# Altium schematic symbol library Schlib.SchLib: 725 symbols (part 3 of 6) (continued)
## GRM21AR72A224KAC5L
designator C?  value 0.22 uF  (hidden comment: *)
Multilayer Ceramic Capacitor, 0.22 uF, 100 V, ± 10%, X7R, 0805 [2012 Metric]; Manufacturer: Murata; Manufacturer Part Number: GRM21AR72A224KAC5L; Supplier: Mouser; Supplier Part Number: 81-GRM21AR72A224KC5L; RoHS: Yes; Category: Ceramic Capacitors; Stock: 53713; Pricing: 1=0.26, 10=0.117, 50=0.117, 100=0.071, 1000=0.06, 10000=0.047 (USD); ComponentLink1URL: https://datasheet.ciiva.com/3777/194grm21ar72a224kac523-3777637.pdf?src-supplier=Arrow+Electronics; ComponentLink1Description: https://datasheet.ciiva.com/3777/194grm21ar72a224kac523-3777637.pdf?src-supplier=Arrow+Electronics; ComponentLink2URL: https://datasheet.ciiva.com/2989/product-2989680.pdf?src-supplier=Avnet; ComponentLink2Description: https://datasheet.ciiva.com/2989/product-2989680.pdf?src-supplier=Avnet; ComponentLink3URL: https://datasheet.ciiva.com/11787/0900766b80ef921d-11787385.pdf?src-supplier=Rs; ComponentLink3Description: https://datasheet.ciiva.com/11787/0900766b80ef921d-11787385.pdf?src-supplier=Rs; ComponentLink4URL: https://datasheet.ciiva.com/29200/453038-da-01-en-vs-kondensator-0805-29200660.pdf?src-supplier=Conrad; ComponentLink4Description: https://datasheet.ciiva.com/29200/453038-da-01-en-vs-kondensator-0805-29200660.pdf?src-supplier=Conrad; ComponentLink5URL: https://datasheet.ciiva.com/6270/partnumbering-e-01-6270361.pdf?src-supplier=Digikey; ComponentLink5Description: https://datasheet.ciiva.com/6270/partnumbering-e-01-6270361.pdf?src-supplier=Digikey; ComponentLink6URL: https://datasheet.ciiva.com/6270/partnumbering-e-01-6270363.pdf?src-supplier=Digikey; ComponentLink6Description: https://datasheet.ciiva.com/6270/partnumbering-e-01-6270363.pdf?src-supplier=Digikey; ComponentLink7URL: https://datasheet.ciiva.com/6270/partnumbering-e-01-6270364.pdf?src-supplier=Digikey; ComponentLink7Description: https://datasheet.ciiva.com/6270/partnumbering-e-01-6270364.pdf?src-supplier=Digikey; ComponentLink8URL: https://datasheet.ciiva.com/16385/product-16385854.pdf?src-supplier=Future+Electronics; ComponentLink8Description: https://datasheet.ciiva.com/16385/product-16385854.pdf?src-supplier=Future+Electronics; Case/Package: 0805
footprint C 0805
pins: 1 B, 2 A

## GRM21BR61A476ME15L
designator C?  value 47uF  (hidden comment: *)
Multilayer Ceramic Capacitor, 47 uF, 10 V, ï¿½ 20%, X5R, 0805 [2012 Metric]; Manufacturer: Murata; Manufacturer Part Number: GRM21BR61A476ME15L; Material: 4241ConductorMaterial; Voltage Rating: 10V; Dissipation Factor: 0.035%; Supplier: Farnell; Supplier Part Number: 2611939; RoHS: Yes; Category: Ceramic Capacitors; Stock: 320783; Pricing: 5=0.389, 50=0.251, 250=0.234, 500=0.217, 1500=0.213 (EUR); Mounting Technology: Surface Mount; Case/Package: 0805; Case Code (Metric): 2012; Case Code (Imperial): 0805; Dielectric Material: Ceramic; Min Operating Temperature: -55°C; Max Operating Temperature: 85°C; Tolerance: 20%; Packaging: Cut Tape; Dielectric: X5R; Voltage: 10V; Termination: SMD/SMT; Voltage Rating (DC): 10V; Series: GRM; Length: 0.079inch; Width: 0.049inch; Height: 1.25mm; Thickness: 0.057inch; Depth: 1.25mm; Reach SVHC Compliant: No; Lead Free: Lead Free; RoHS Compliant: Yes; ComponentLink1URL: http://www.farnell.com/datasheets/2079183.pdf?src-supplier=Farnell; ComponentLink1Description: http://www.farnell.com/datasheets/2079183.pdf?src-supplier=Farnell; ComponentLink2URL: http://www.farnell.com/datasheets/2079183.pdf?src-supplier=Newark; ComponentLink2Description: http://www.farnell.com/datasheets/2079183.pdf?src-supplier=Newark; ComponentLink3URL: http://www.farnell.com/datasheets/2079183.pdf?src-supplier=Element14; ComponentLink3Description: http://www.farnell.com/datasheets/2079183.pdf?src-supplier=Element14; ComponentLink4URL: https://datasheet.octopart.com/GRM21BR61A476ME15L-Murata-datasheet-66077109.pdf?src-supplier=Element14; ComponentLink4Description: https://datasheet.octopart.com/GRM21BR61A476ME15L-Murata-datasheet-66077109.pdf?src-supplier=Element14; ComponentLink5URL: http://search.murata.co.jp/Ceramy/image/img/A01X/G101/ENG/GRM21BR61A476ME15-01.pdf?src-supplier=Digikey; ComponentLink5Description: http://search.murata.co.jp/Ceramy/image/img/A01X/G101/ENG/GRM21BR61A476ME15-01.pdf?src-supplier=Digikey; ComponentLink6URL: https://search.murata.co.jp/Ceramy/image/img/A01X/G101/ENG/GRM21BR61A476ME15-01.pdf?src-supplier=Digikey; ComponentLink6Description: https://search.murata.co.jp/Ceramy/image/img/A01X/G101/ENG/GRM21BR61A476ME15-01.pdf?src-supplier=Digikey; ComponentLink7URL: http://psearch.en.murata.com/capacitor/product/GRM21BR61A476ME15%23.pdf?src-supplier=Avnet; ComponentLink7Description: http://psearch.en.murata.com/capacitor/product/GRM21BR61A476ME15%23.pdf?src-supplier=Avnet
footprint C 0805
pins: 1 B, 2 A

## GRM21BR61E226ME44K
designator C?  value 22uF  (hidden comment: *)
Multilayer Ceramic Capacitor, 22 uF, 25 V, ± 20%, X5R, 0805 [2012 Metric]; Manufacturer: Murata; Manufacturer Part Number: GRM21BR61E226ME44K; Material: 4241ConductorMaterial; Voltage Rating: 25V; Supplier: Future Electronics; Supplier Part Number: 1092989; RoHS: Yes; Category: Ceramic Capacitors; Stock: 140000; Pricing: 10000=0.0652, 20000=0.0635, 30000=0.0618 (USD); Mounting Technology: Surface Mount; Case/Package: 0805; Case Code (Imperial): 0805; Case Code (Metric): 2012; Weight: 0.000335oz; Min Operating Temperature: -55°C; Max Operating Temperature: 85°C; Packaging: Tape and Reel; Tolerance: 20%; Dielectric: X5R; Termination: SMD/SMT; Voltage Rating (DC): 25V; Package Quantity: 10000; Series: GRM; Length: 0.079inch; Width: 1.25mm; Height: 1.25mm; Thickness: 0.057inch; RoHS Compliant: Yes; ComponentLink1URL: http://www.mouser.com/ds/2/281/c02e-2905.pdf?src-supplier=Mouser; ComponentLink1Description: http://www.mouser.com/ds/2/281/c02e-2905.pdf?src-supplier=Mouser; ComponentLink2URL: http://search.murata.co.jp/Ceramy/image/img/A01X/G101/ENG/GRM21BR61E226ME44-01.pdf?src-supplier=Digikey; ComponentLink2Description: http://search.murata.co.jp/Ceramy/image/img/A01X/G101/ENG/GRM21BR61E226ME44-01.pdf?src-supplier=Digikey; ComponentLink3URL: https://search.murata.co.jp/Ceramy/image/img/A01X/G101/ENG/GRM21BR61E226ME44-01.pdf?src-supplier=Digikey; ComponentLink3Description: https://search.murata.co.jp/Ceramy/image/img/A01X/G101/ENG/GRM21BR61E226ME44-01.pdf?src-supplier=Digikey
footprint C 0805
pins: 1 B, 2 A

## GRM21BR61H106KE43K
designator C?  value 10uF  (hidden comment: *)
Ceramic Capacitor, Multilayer, Ceramic, 50V, 10% +Tol, 10% -Tol, X5R, 10uF, Surface Mount, 0805; Manufacturer: Murata; Manufacturer Part Number: GRM21BR61H106KE43K; Material: 4241ConductorMaterial; Dielectric: 1537DielectricType; Supplier: Mouser; Supplier Part Number: 81-GRM21BR61H106KE3K; RoHS: Yes; Category: Ceramic Capacitors; Stock: 120155; Pricing: 1=0.34, 10=0.155, 50=0.155, 100=0.093, 1000=0.073, 10000=0.065 (USD); Case/Package: 339Case; Min Operating Temperature: -55°C; Max Operating Temperature: 85°C; Tolerance: 10%; Voltage Rating: 50V; Voltage Rating (DC): 50V; Length: 2mm; Width: 1.25mm; Height: 1.45mm; Thickness: 1.25mm
footprint C 0805
pins: 1 B, 2 A

## GRM21BR61H475KE51L
designator C?  value 4.7uF  (hidden comment: *)
Multilayer Ceramic Capacitor, 4.7 uF, 50 V, ± 10%, X5R, 0805 [2012 Metric]; Manufacturer: Murata; Manufacturer Part Number: GRM21BR61H475KE51L; Voltage Rating: 50V; Supplier: Mouser; Supplier Part Number: 81-GRM21BR61H475KE1L; RoHS: Yes; Category: Ceramic Capacitors; Stock: 623269; Pricing: 1=0.26, 10=0.107, 50=0.107, 100=0.062, 1000=0.054, 10000=0.042 (USD); Mounting Technology: Surface Mount; Case/Package: 0805; Case Code (Metric): 2012; Material: Ceramic; Case Code (Imperial): 0805; Min Operating Temperature: -55°C; Max Operating Temperature: 85°C; Tolerance: 10%; Packaging: Tape and Reel; Dielectric: X5R; Series: GRM; Voltage Rating (DC): 50V; Length: 2mm; Width: 0.049inch; Height: 1.25mm; Thickness: 0.055inch; Depth: 1.25mm; Reach SVHC Compliant: No; RoHS Compliant: Yes; Lead Free: 5697LeadFree; ComponentLink1URL: http://www.farnell.com/datasheets/2079186.pdf?src-supplier=Farnell; ComponentLink1Description: http://www.farnell.com/datasheets/2079186.pdf?src-supplier=Farnell; ComponentLink2URL: https://datasheet.octopart.com/GRM21BR61H475KE51L-Murata-datasheet-22122223.pdf?src-supplier=Future+Electronics; ComponentLink2Description: https://datasheet.octopart.com/GRM21BR61H475KE51L-Murata-datasheet-22122223.pdf?src-supplier=Future+Electronics; ComponentLink3URL: http://www.farnell.com/datasheets/2079186.pdf?src-supplier=Element14; ComponentLink3Description: http://www.farnell.com/datasheets/2079186.pdf?src-supplier=Element14; ComponentLink4URL: https://datasheet.octopart.com/GRM21BR61H475KE51L-Murata-datasheet-66077112.pdf?src-supplier=Element14; ComponentLink4Description: https://datasheet.octopart.com/GRM21BR61H475KE51L-Murata-datasheet-66077112.pdf?src-supplier=Element14; ComponentLink5URL: http://search.murata.co.jp/Ceramy/image/img/A01X/G101/ENG/GRM21BR61H475KE51-01.pdf?src-supplier=Digikey; ComponentLink5Description: http://search.murata.co.jp/Ceramy/image/img/A01X/G101/ENG/GRM21BR61H475KE51-01.pdf?src-supplier=Digikey; ComponentLink6URL: https://search.murata.co.jp/Ceramy/image/img/A01X/G101/ENG/GRM21BR61H475KE51-01.pdf?src-supplier=Digikey; ComponentLink6Description: https://search.murata.co.jp/Ceramy/image/img/A01X/G101/ENG/GRM21BR61H475KE51-01.pdf?src-supplier=Digikey; ComponentLink7URL: http://www.farnell.com/datasheets/2079186.pdf?src-supplier=Newark; ComponentLink7Description: http://www.farnell.com/datasheets/2079186.pdf?src-supplier=Newark
footprint C 0805
pins: 1 B, 2 A

## GRM21BZ71A226ME15L
designator C?  value 22uF  (hidden comment: *)
Cap Ceramic 22uF 10V X7R 20% Pad SMD 0805 125C T/R; Manufacturer: Murata; Manufacturer Part Number: GRM21BZ71A226ME15L; Supplier: Digi-Key; Supplier Part Number: 490-GRM21BZ71A226ME15LCT-ND; RoHS: Yes; Category: Ceramic Capacitors; Stock: 88479; Pricing: 1=0.39000, 10=0.26800, 50=0.18740, 100=0.16060, 500=0.12044, 1000=0.10171 (USD); RoHS Compliant: Yes; Case/Package: 0805
footprint C 0805
pins: 1 B, 2 A

## GRM31CR60E227ME11L
designator C?
220 µF ±20% 2.5V Ceramic Capacitor X5R 1206 (3216 Metric); Manufacturer Part Number: GRM31CR60E227ME11L
footprint CAPC3216X190N
pins: 1, 2

## GRM31CR61A107MEA8K
designator C?  value 100uF  (hidden comment: *)
100 µF ±20% 10V Ceramic Capacitor X5R 1206 (3216 Metric); Manufacturer: Murata; Manufacturer Part Number: GRM31CR61A107MEA8K; Supplier: Digi-Key; Supplier Part Number: 490-GRM31CR61A107MEA8KCT-ND; RoHS: Yes; Category: Ceramic Capacitors; Stock: 640; Pricing: 1=0.46000, 10=0.32800, 50=0.24760, 100=0.21570, 500=0.15978, 1000=0.13581, 2500=0.12782 (USD); Case/Package: 1206
pins: 1 B, 2 A

## GRM32ER71A476KE15L
designator C?  value 47uF  (hidden comment: *)
Multilayer Ceramic Capacitor, 47 uF, 10 V, ± 10%, X7R, 1210 [3225 Metric]; Manufacturer: Murata; Manufacturer Part Number: GRM32ER71A476KE15L; Supplier: Future Electronics; Supplier Part Number: 2708113; RoHS: Yes; Category: Ceramic Capacitors; Stock: 321000; Pricing: 1000=0.3, 2000=0.29, 3000=0.29, 5000=0.285, 10000=0.275 (USD); Lead Free: 5697LeadFree; ComponentLink1URL: https://datasheet.ciiva.com/143/product-143362.pdf?src-supplier=Digikey; ComponentLink1Description: https://datasheet.ciiva.com/143/product-143362.pdf?src-supplier=Digikey; ComponentLink2URL: https://datasheet.ciiva.com/11786/0900766b80ef921d-11786706.pdf?src-supplier=Rs; ComponentLink2Description: https://datasheet.ciiva.com/11786/0900766b80ef921d-11786706.pdf?src-supplier=Rs; ComponentLink3URL: https://datasheet.ciiva.com/22703/528684-22703394.pdf?src-supplier=Element14; ComponentLink3Description: https://datasheet.ciiva.com/22703/528684-22703394.pdf?src-supplier=Element14; ComponentLink4URL: https://datasheet.ciiva.com/143/partnumbering-e-01-143361.pdf?src-supplier=Digikey; ComponentLink4Description: https://datasheet.ciiva.com/143/partnumbering-e-01-143361.pdf?src-supplier=Digikey; ComponentLink5URL: https://datasheet.ciiva.com/143/partnumbering-e-01-143363.pdf?src-supplier=Digikey; ComponentLink5Description: https://datasheet.ciiva.com/143/partnumbering-e-01-143363.pdf?src-supplier=Digikey; ComponentLink6URL: https://datasheet.ciiva.com/48671/product-48671335.pdf?src-supplier=Avnet; ComponentLink6Description: https://datasheet.ciiva.com/48671/product-48671335.pdf?src-supplier=Avnet; ComponentLink7URL: https://datasheet.ciiva.com/2989/product-2989821.pdf?src-supplier=Avnet; ComponentLink7Description: https://datasheet.ciiva.com/2989/product-2989821.pdf?src-supplier=Avnet; ComponentLink8URL: https://datasheet.ciiva.com/16497/product-16497005.pdf?src-supplier=Future+Electronics; ComponentLink8Description: https://datasheet.ciiva.com/16497/product-16497005.pdf?src-supplier=Future+Electronics; Case/Package: 1210
footprint C 1210
pins: 1 B, 2 A

## GRM033R60J104ME19D
designator C?  value 0.1uF  (hidden comment: *)
Multilayer Ceramic Capacitor, 0.1 uF, 6.3 V, ± 20%, X5R, 0201 [0603 Metric]; Manufacturer: Murata; Manufacturer Part Number: GRM033R60J104ME19D; Material: 4241ConductorMaterial; Supplier: Future Electronics; Supplier Part Number: 5789086; RoHS: Yes; Category: Ceramic Capacitors; Stock: 60000; Pricing: 15000=0.0013, 60000=0.0013, 225000=0.0012, 600000=0.0012, 1500000=0.0011 (USD); Lead Free: 5697LeadFree; ComponentLink1URL: https://datasheet.ciiva.com/18184/getdatasheetpartid-727009-18184034.pdf?src-supplier=Verical; ComponentLink1Description: https://datasheet.ciiva.com/18184/getdatasheetpartid-727009-18184034.pdf?src-supplier=Verical; ComponentLink2URL: https://datasheet.ciiva.com/5418/product-5418194.pdf?src-supplier=Mouser; ComponentLink2Description: https://datasheet.ciiva.com/5418/product-5418194.pdf?src-supplier=Mouser; ComponentLink3URL: https://datasheet.ciiva.com/155/partnumbering-e-01-155872.pdf?src-supplier=Digikey; ComponentLink3Description: https://datasheet.ciiva.com/155/partnumbering-e-01-155872.pdf?src-supplier=Digikey; ComponentLink4URL: https://datasheet.ciiva.com/155/partnumbering-e-01-155873.pdf?src-supplier=Digikey; ComponentLink4Description: https://datasheet.ciiva.com/155/partnumbering-e-01-155873.pdf?src-supplier=Digikey; ComponentLink5URL: https://datasheet.ciiva.com/155/partnumbering-e-01-155874.pdf?src-supplier=Digikey; ComponentLink5Description: https://datasheet.ciiva.com/155/partnumbering-e-01-155874.pdf?src-supplier=Digikey; Case/Package: 0201
footprint C 0201 (0603 Metric)
pins: 1 B, 2 A

## GRM033R60J105MEA2D
designator C?  value 1uF  (hidden comment: *)
Multilayer Ceramic Capacitor, 1 uF, 6.3 V, ï¿½ 20%, X5R, 0201 [0603 Metric]; Manufacturer: Murata; Manufacturer Part Number: GRM033R60J105MEA2D; Material: 4241ConductorMaterial; Voltage Rating: 6.3V; Supplier: Rs; Supplier Part Number: 2763719; RoHS: Yes; Category: Ceramic Capacitors; Stock: 12000; Pricing: 1000=0.008, 10000=0.007 (EUR); Mounting Technology: Surface Mount; Case/Package: 0201; Case Code (Imperial): 0201; Case Code (Metric): 0603; Weight: 1.2E-05oz; Min Operating Temperature: -55°C; Max Operating Temperature: 85°C; Package Quantity: 1; Packaging: Cut Tape; Tolerance: 20%; Voltage Rating (DC): 6.3V; Dielectric: X5R; Termination: SMD/SMT; Voltage: 6.3V; Series: GRM; Length: 0.6mm; Width: 0.3mm; Height: 0.3mm; Depth: 0.3mm; Thickness: 300um; Reach SVHC Compliant: No; Lead Free: Lead Free; RoHS Compliant: Yes; ComponentLink1URL: https://datasheet.ciiva.com/18699/grm033r60j105mea2-02-18699520.pdf?src-supplier=Digikey; ComponentLink1Description: https://datasheet.ciiva.com/18699/grm033r60j105mea2-02-18699520.pdf?src-supplier=Digikey; ComponentLink2URL: https://datasheet.ciiva.com/18699/partnumbering-e-01-18699519.pdf?src-supplier=Digikey; ComponentLink2Description: https://datasheet.ciiva.com/18699/partnumbering-e-01-18699519.pdf?src-supplier=Digikey; ComponentLink3URL: https://datasheet.ciiva.com/24218/c02e-24218376.pdf?src-supplier=Mouser; ComponentLink3Description: https://datasheet.ciiva.com/24218/c02e-24218376.pdf?src-supplier=Mouser
footprint C 0201 (0603 Metric)
pins: 1 B, 2 A

## GRM033R60J225ME15D
designator C?  value 2.2uF  (hidden comment: *)
Multilayer Ceramic Capacitor, 2.2 uF, 6.3 V, ± 20%, X5R, 0201 [0603 Metric]; Manufacturer: Murata; Manufacturer Part Number: GRM033R60J225ME15D; Material: 4241ConductorMaterial; Dielectric: 1537DielectricType; Voltage Rating (DC): 6.3V; Supplier: Future Electronics; Supplier Part Number: 3126634; RoHS: Yes; Category: Ceramic Capacitors; Stock: 75000; Pricing: 15000=0.0316, 30000=0.0311, 45000=0.0309, 60000=0.0307, 75000=0.0301 (USD); Height: 350um; ComponentLink1URL: http://search.murata.co.jp/Ceramy/image/img/A01X/G101/ENG/GRM033R60J225ME15-01.pdf?src-supplier=Digikey; ComponentLink1Description: http://search.murata.co.jp/Ceramy/image/img/A01X/G101/ENG/GRM033R60J225ME15-01.pdf?src-supplier=Digikey; ComponentLink2URL: https://datasheet.octopart.com/GRM033R60J225ME15D-Murata-datasheet-86813718.pdf?src-supplier=Future+Electronics; ComponentLink2Description: https://datasheet.octopart.com/GRM033R60J225ME15D-Murata-datasheet-86813718.pdf?src-supplier=Future+Electronics; ComponentLink3URL: https://datasheet.octopart.com/GRM033R60J225ME15D-Murata-datasheet-165579666.pdf?src-supplier=TME; ComponentLink3Description: https://datasheet.octopart.com/GRM033R60J225ME15D-Murata-datasheet-165579666.pdf?src-supplier=TME; Case/Package: 0201
footprint C 0201 (0603 Metric)
pins: 1 B, 2 A

## GRM033R61A224KE90D
designator C?  value 220nF  (hidden comment: *)
10V 220nF X5R ±10% 0201 Multilayer Ceramic Capacitors MLCC - SMD/SMT ROHS; Manufacturer: Murata; Manufacturer Part Number: GRM033R61A224KE90D; Manufacturer Lifecycle Status: IN PRODUCTION; Supplier: Arrow Electronics; Supplier Part Number: GRM033R61A224KE90D; RoHS: Compliant; Category: Ceramic Capacitors; Stock: 1215000; Pricing: 15000=0.0036, 75000=0.002 (USD); Case/Package: 0201; Case Code (Imperial): 0201; Case Code (Metric): 0603; Dielectric: X5R; Dielectric Material: Ceramic; Height: 300µm; Length: 600µm; Lifecycle Status: Production; Material: Ceramic; Max Operating Temperature: 85°C; Min Operating Temperature: -55°C; Mounting Technology: Surface Mount; Number of Terminals: 2; Packaging: Tape & Reel (TR); REACH SVHC: Yes; Schedule B: 8532240020, 8532240020|8532240020, 8532240020|8532240020|8532240020, 8532240020|8532240020|8532240020|8532240020; Thickness: 300µm; Tolerance: 10%; Voltage Rating: 10V; Voltage Rating (DC): 10V; Width: 300µm; ComponentLink1URL: https://datasheet.octopart.com:443/GRM033R61A224KE90D-Murata-datasheet-165579666.pdf?src-supplier=TME; ComponentLink1Description: https://datasheet.octopart.com:443/GRM033R61A224KE90D-Murata-datasheet-165579666.pdf?src-supplier=TME; ComponentLink2URL: https://datasheet.octopart.com:443/GRM033R61A224KE90D-Murata-datasheet-141274204.pdf?src-supplier=Ciiva; ComponentLink2Description: https://datasheet.octopart.com:443/GRM033R61A224KE90D-Murata-datasheet-141274204.pdf?src-supplier=Ciiva; ComponentLink3URL: https://datasheet.octopart.com:443/GRM033R61A224KE90D-Murata-datasheet-140676166.pdf?src-supplier=Ciiva; ComponentLink3Description: https://datasheet.octopart.com:443/GRM033R61A224KE90D-Murata-datasheet-140676166.pdf?src-supplier=Ciiva; ComponentLink4URL: https://datasheet.octopart.com:443/GRM033R61A224KE90D-Murata-datasheet-138738403.pdf?src-supplier=Ciiva; ComponentLink4Description: https://datasheet.octopart.com:443/GRM033R61A224KE90D-Murata-datasheet-138738403.pdf?src-supplier=Ciiva; ComponentLink5URL: https://datasheet.octopart.com:443/GRM033R61A224KE90D-Murata-datasheet-82944607.pdf?src-supplier=Future+Electronics; ComponentLink5Description: https://datasheet.octopart.com:443/GRM033R61A224KE90D-Murata-datasheet-82944607.pdf?src-supplier=Future+Electronics; ComponentLink6URL: https://datasheet.octopart.com/GRM033R61A224KE90D-Murata-datasheet-12515295.pdf; ComponentLink6Description: https://datasheet.octopart.com/GRM033R61A224KE90D-Murata-datasheet-12515295.pdf; ComponentLink7URL: https://datasheet.octopart.com/GRM033R61A224KE90D-Murata-datasheet-12510076.pdf; ComponentLink7Description: https://datasheet.octopart.com/GRM033R61A224KE90D-Murata-datasheet-12510076.pdf; ComponentLink8URL: https://datasheet.octopart.com/GRM033R61A224KE90D-Murata-datasheet-11978611.pdf; ComponentLink8Description: https://datasheet.octopart.com/GRM033R61A224KE90D-Murata-datasheet-11978611.pdf; ComponentLink9URL: https://datasheet.octopart.com/GRM033R61A224KE90D-Murata-datasheet-10025737.pdf; ComponentLink9Description: https://datasheet.octopart.com/GRM033R61A224KE90D-Murata-datasheet-10025737.pdf; ComponentLink10URL: https://datasheet.octopart.com/GRM033R61A224KE90D-Murata-datasheet-8819587.pdf; ComponentLink10Description: https://datasheet.octopart.com/GRM033R61A224KE90D-Murata-datasheet-8819587.pdf; ComponentLink11URL: https://datasheet.octopart.com/GRM033R61A224KE90D-Murata-datasheet-38882175.pdf; ComponentLink11Description: https://datasheet.octopart.com/GRM033R61A224KE90D-Murata-datasheet-38882175.pdf; ComponentLink12URL: https://datasheet.octopart.com:443/GRM033R61A224KE90D-Murata-datasheet-140568762.pdf?src-supplier=Arrow.cn; ComponentLink12Description: https://datasheet.octopart.com:443/GRM033R61A224KE90D-Murata-datasheet-140568762.pdf?src-supplier=Arrow.cn; ComponentLink13URL: http://sigma.octopart.com:80/reach_statement/Murata-company-16.pdf?src-supplier=Compliance+Statements; ComponentLink13Description: http://sigma.octopart.com:80/reach_statement/Murata-company-16.pdf?src-supplier=Compliance+Statements
footprint C 0201 (0603 Metric)
pins: 1 B, 2 A

## GRM033R71E222KA12D
designator C?  value 2.2nF  (hidden comment: *)
Multilayer Ceramic Capacitor, 2200 pF, 25 V, ï¿½ 10%, X7R, 0201 [0603 Metric]; Manufacturer: Murata; Manufacturer Part Number: GRM033R71E222KA12D; Material: 4241ConductorMaterial; Supplier: Future Electronics; Supplier Part Number: 9087202; RoHS: Yes; Category: Ceramic Capacitors; Stock: 480000; Pricing: 15000=0.0014, 60000=0.0014, 225000=0.0013, 450000=0.0013, 1125000=0.0012 (USD); ComponentLink1URL: http://www.mouser.com/ds/2/281/c02e-2905.pdf?src-supplier=Mouser; ComponentLink1Description: http://www.mouser.com/ds/2/281/c02e-2905.pdf?src-supplier=Mouser; ComponentLink2URL: http://www.farnell.com/datasheets/2867852.pdf?src-supplier=Farnell; ComponentLink2Description: http://www.farnell.com/datasheets/2867852.pdf?src-supplier=Farnell; ComponentLink3URL: https://datasheet.octopart.com/GRM033R71E222KA12D-Murata-datasheet-82944625.pdf?src-supplier=Future+Electronics; ComponentLink3Description: https://datasheet.octopart.com/GRM033R71E222KA12D-Murata-datasheet-82944625.pdf?src-supplier=Future+Electronics; ComponentLink4URL: http://search.murata.co.jp/Ceramy/image/img/A01X/G101/ENG/GRM033R71E222KA12-01.pdf?src-supplier=Digikey; ComponentLink4Description: http://search.murata.co.jp/Ceramy/image/img/A01X/G101/ENG/GRM033R71E222KA12-01.pdf?src-supplier=Digikey; ComponentLink5URL: http://www.farnell.com/datasheets/2867852.pdf?src-supplier=Newark; ComponentLink5Description: http://www.farnell.com/datasheets/2867852.pdf?src-supplier=Newark; ComponentLink6URL: https://datasheet.octopart.com/GRM033R71E222KA12D-Murata-datasheet-165579666.pdf?src-supplier=TME; ComponentLink6Description: https://datasheet.octopart.com/GRM033R71E222KA12D-Murata-datasheet-165579666.pdf?src-supplier=TME; Case/Package: 0201
footprint C 0201 (0603 Metric)
pins: 1 B, 2 A

## GRM035R60J475ME15J
designator C?  value 4.7uF  (hidden comment: *)
Multilayer Ceramic Capacitor, 4.7 uF, 6.3 V, ± 20%, X5R, 0201 [0603 Metric]; Manufacturer: Murata; Manufacturer Part Number: GRM035R60J475ME15J; Material: 4241ConductorMaterial; Dielectric: 1537DielectricType; Voltage Rating: 6.3V; Supplier: Avnet; Supplier Part Number: GRM035R60J475ME15J; RoHS: Yes; Category: Ceramic Capacitors; Stock: 50000; Pricing: 50000=0.03841 (USD); Case/Package: 0201; Min Operating Temperature: -55°C; Max Operating Temperature: 85°C; Tolerance: 20%; Voltage Rating (DC): 6.3V; Length: 600um; Width: 300um; Height: 550um; Thickness: 500um; RoHS Compliant: Yes; ComponentLink1URL: https://datasheet.octopart.com/GRM035R60J475ME15J-Murata-datasheet-165579666.pdf?src-supplier=TME; ComponentLink1Description: https://datasheet.octopart.com/GRM035R60J475ME15J-Murata-datasheet-165579666.pdf?src-supplier=TME
footprint C 0201 (0603 Metric)
pins: 1 B, 2 A

## GRM152R60J105ME15D
designator C?  value 1uF  (hidden comment: *)
Multilayer Ceramic Capacitor, 1 uF, 6.3 V, ± 20%, X5R, 0402 [1005 Metric]; Manufacturer: Murata; Manufacturer Part Number: GRM152R60J105ME15D; Material: 4241ConductorMaterial; Supplier: Mouser; Supplier Part Number: 81-GRM152R60J105ME5D; RoHS: Yes; Category: Ceramic Capacitors; Stock: 134223; Pricing: 1=0.2, 10=0.085, 50=0.085, 100=0.051, 1000=0.043, 10000=0.036 (USD); Height: 220um; ComponentLink1URL: http://search.murata.co.jp/Ceramy/image/img/A01X/G101/ENG/GRM152R60J105ME15-01.pdf?src-supplier=Digikey; ComponentLink1Description: http://search.murata.co.jp/Ceramy/image/img/A01X/G101/ENG/GRM152R60J105ME15-01.pdf?src-supplier=Digikey; ComponentLink2URL: https://datasheet.octopart.com/GRM152R60J105ME15D-Murata-datasheet-149522820.pdf?src-supplier=Newark; ComponentLink2Description: https://datasheet.octopart.com/GRM152R60J105ME15D-Murata-datasheet-149522820.pdf?src-supplier=Newark; ComponentLink3URL: https://datasheet.octopart.com/GRM152R60J105ME15D-Murata-datasheet-32479577.pdf?src-supplier=Future+Electronics; ComponentLink3Description: https://datasheet.octopart.com/GRM152R60J105ME15D-Murata-datasheet-32479577.pdf?src-supplier=Future+Electronics; Case/Package: 0402
footprint C 0402 (1005 Metric) (Chip Capacitor, Body 1.0x0.5mm, IPC High Density)
pins: 1 B, 2 A

## GRM155R60J106ME15J
designator C?  value 10uF  (hidden comment: *)
Cap Ceramic Monolithic 10uF 6.3VDC 20% SMD Paper T/R; Manufacturer: Murata; Manufacturer Part Number: GRM155R60J106ME15J; Supplier: Digi-Key; Supplier Part Number: 490-GRM155R60J106ME15JCT-ND; RoHS: Yes; Category: Ceramic Capacitors; Stock: 103616; Pricing: 1=0.18000, 10=0.12800, 50=0.07260, 100=0.06020, 500=0.04220, 1000=0.03494, 2500=0.03252, 5000=0.02975 (USD); Case/Package: 0402
footprint C 0402 (1005 Metric) (Chip Capacitor, Body 1.0x0.5mm, IPC High Density)
pins: 1 B, 2 A

## GRM155R61A106ME11D
designator C?  value 10uF  (hidden comment: *)
Multilayer Ceramic Capacitor, 10 uF, 10 V, ± 20%, X5R, 0402 [1005 Metric]; Manufacturer: Murata; Manufacturer Part Number: GRM155R61A106ME11D; Supplier: Digi-Key; Supplier Part Number: 490-GRM155R61A106ME11DCT-ND; RoHS: Yes; Category: Ceramic Capacitors; Stock: 37673; Pricing: 1=0.12, 10=0.084, 50=0.0478, 100=0.0396, 500=0.02776, 1000=0.02298, 2500=0.02138, 5000=0.01956 (USD); ComponentLink1URL: https://datasheet.octopart.com/GRM155R61A106ME11D-Murata-datasheet-155239053.pdf?src-supplier=Element14; ComponentLink1Description: https://datasheet.octopart.com/GRM155R61A106ME11D-Murata-datasheet-155239053.pdf?src-supplier=Element14; ComponentLink2URL: https://datasheet.octopart.com/GRM155R61A106ME11D-Murata-datasheet-165579666.pdf?src-supplier=TME; ComponentLink2Description: https://datasheet.octopart.com/GRM155R61A106ME11D-Murata-datasheet-165579666.pdf?src-supplier=TME; Case/Package: 0402
footprint C 0402 (1005 Metric) (Chip Capacitor, Body 1.0x0.5mm, IPC High Density)
pins: 1 B, 2 A

## GRM155R61H474KE11D
designator R?  value 470nF  (hidden comment: *)
Cap, 0.47Uf, 50V, Mlcc, 0402 Rohs Compliant: Yes |Murata GRM155R61H474KE11D; Manufacturer: Murata; Manufacturer Lifecycle Status: IN PRODUCTION; Dielectric: X5R; Dielectric Material: Ceramic; Tolerance: 10%; Supplier: Farnell; Supplier Part Number: 3582804; Manufacturer Part Number: GRM155R61H474KE11D; RoHS: Compliant; Category: Ceramic Capacitors; Stock: 44825; Pricing: 10=0.0299, 100=0.0249, 500=0.0183, 2500=0.0141, 5000=0.0138 (GBP); Case/Package: 0402; Height: 500µm; Length: 1mm; Lifecycle Status: Production; Material: Ceramic; Max Operating Temperature: 85°C; Min Operating Temperature: -55°C; Mounting Technology: Surface Mount; Number of Terminals: 2; REACH SVHC: Yes; Schedule B: 8532240020, 8532240020|8532240020, 8532240020|8532240020|8532240020, 8532240020|8532240020|8532240020|8532240020; Thickness: 500µm; Voltage Rating: 50V; Voltage Rating (DC): 50V; Width: 500µm; ComponentLink1URL: https://datasheet.octopart.com:443/GRM155R61H474KE11D-Murata-datasheet-149523035.pdf?src-supplier=Newark; ComponentLink1Description: https://datasheet.octopart.com:443/GRM155R61H474KE11D-Murata-datasheet-149523035.pdf?src-supplier=Newark; ComponentLink2URL: https://datasheet.octopart.com:443/GRM155R61H474KE11D-Murata-datasheet-165579666.pdf?src-supplier=TME; ComponentLink2Description: https://datasheet.octopart.com:443/GRM155R61H474KE11D-Murata-datasheet-165579666.pdf?src-supplier=TME; ComponentLink3URL: https://datasheet.octopart.com:443/GRM155R61H474KE11D-Murata-datasheet-141266224.pdf?src-supplier=Ciiva; ComponentLink3Description: https://datasheet.octopart.com:443/GRM155R61H474KE11D-Murata-datasheet-141266224.pdf?src-supplier=Ciiva; ComponentLink4URL: https://datasheet.octopart.com:443/GRM155R61H474KE11D-Murata-datasheet-140690652.pdf?src-supplier=Ciiva; ComponentLink4Description: https://datasheet.octopart.com:443/GRM155R61H474KE11D-Murata-datasheet-140690652.pdf?src-supplier=Ciiva; ComponentLink5URL: https://datasheet.octopart.com:443/GRM155R61H474KE11D-Murata-datasheet-138740827.pdf?src-supplier=Ciiva; ComponentLink5Description: https://datasheet.octopart.com:443/GRM155R61H474KE11D-Murata-datasheet-138740827.pdf?src-supplier=Ciiva; ComponentLink6URL: https://datasheet.octopart.com:443/GRM155R61H474KE11D-Murata-datasheet-118179445.pdf?src-supplier=LCSC; ComponentLink6Description: https://datasheet.octopart.com:443/GRM155R61H474KE11D-Murata-datasheet-118179445.pdf?src-supplier=LCSC; ComponentLink7URL: https://datasheet.octopart.com:443/GRM155R61H474KE11D-Murata-datasheet-99353828.pdf?src-supplier=Future+Electronics; ComponentLink7Description: https://datasheet.octopart.com:443/GRM155R61H474KE11D-Murata-datasheet-99353828.pdf?src-supplier=Future+Electronics; ComponentLink8URL: https://datasheet.octopart.com/GRM155R61H474KE11D-Murata-datasheet-12515295.pdf; ComponentLink8Description: https://datasheet.octopart.com/GRM155R61H474KE11D-Murata-datasheet-12515295.pdf; ComponentLink9URL: https://datasheet.octopart.com/GRM155R61H474KE11D-Murata-datasheet-12510076.pdf; ComponentLink9Description: https://datasheet.octopart.com/GRM155R61H474KE11D-Murata-datasheet-12510076.pdf; ComponentLink10URL: https://datasheet.octopart.com/GRM155R61H474KE11D-Murata-datasheet-11978611.pdf; ComponentLink10Description: https://datasheet.octopart.com/GRM155R61H474KE11D-Murata-datasheet-11978611.pdf; ComponentLink11URL: https://datasheet.octopart.com/GRM155R61H474KE11D-Murata-datasheet-10025737.pdf; ComponentLink11Description: https://datasheet.octopart.com/GRM155R61H474KE11D-Murata-datasheet-10025737.pdf; ComponentLink12URL: https://datasheet.octopart.com/GRM155R61H474KE11D-Murata-datasheet-8819587.pdf; ComponentLink12Description: https://datasheet.octopart.com/GRM155R61H474KE11D-Murata-datasheet-8819587.pdf; ComponentLink13URL: http://sigma.octopart.com:80/reach_statement/Murata-company-16.pdf?src-supplier=Compliance+Statements; ComponentLink13Description: http://sigma.octopart.com:80/reach_statement/Murata-company-16.pdf?src-supplier=Compliance+Statements
footprint C 0402 (1005 Metric) (Chip Capacitor, Body 1.0x0.5mm, IPC High Density)
pins: 1 B, 2 A

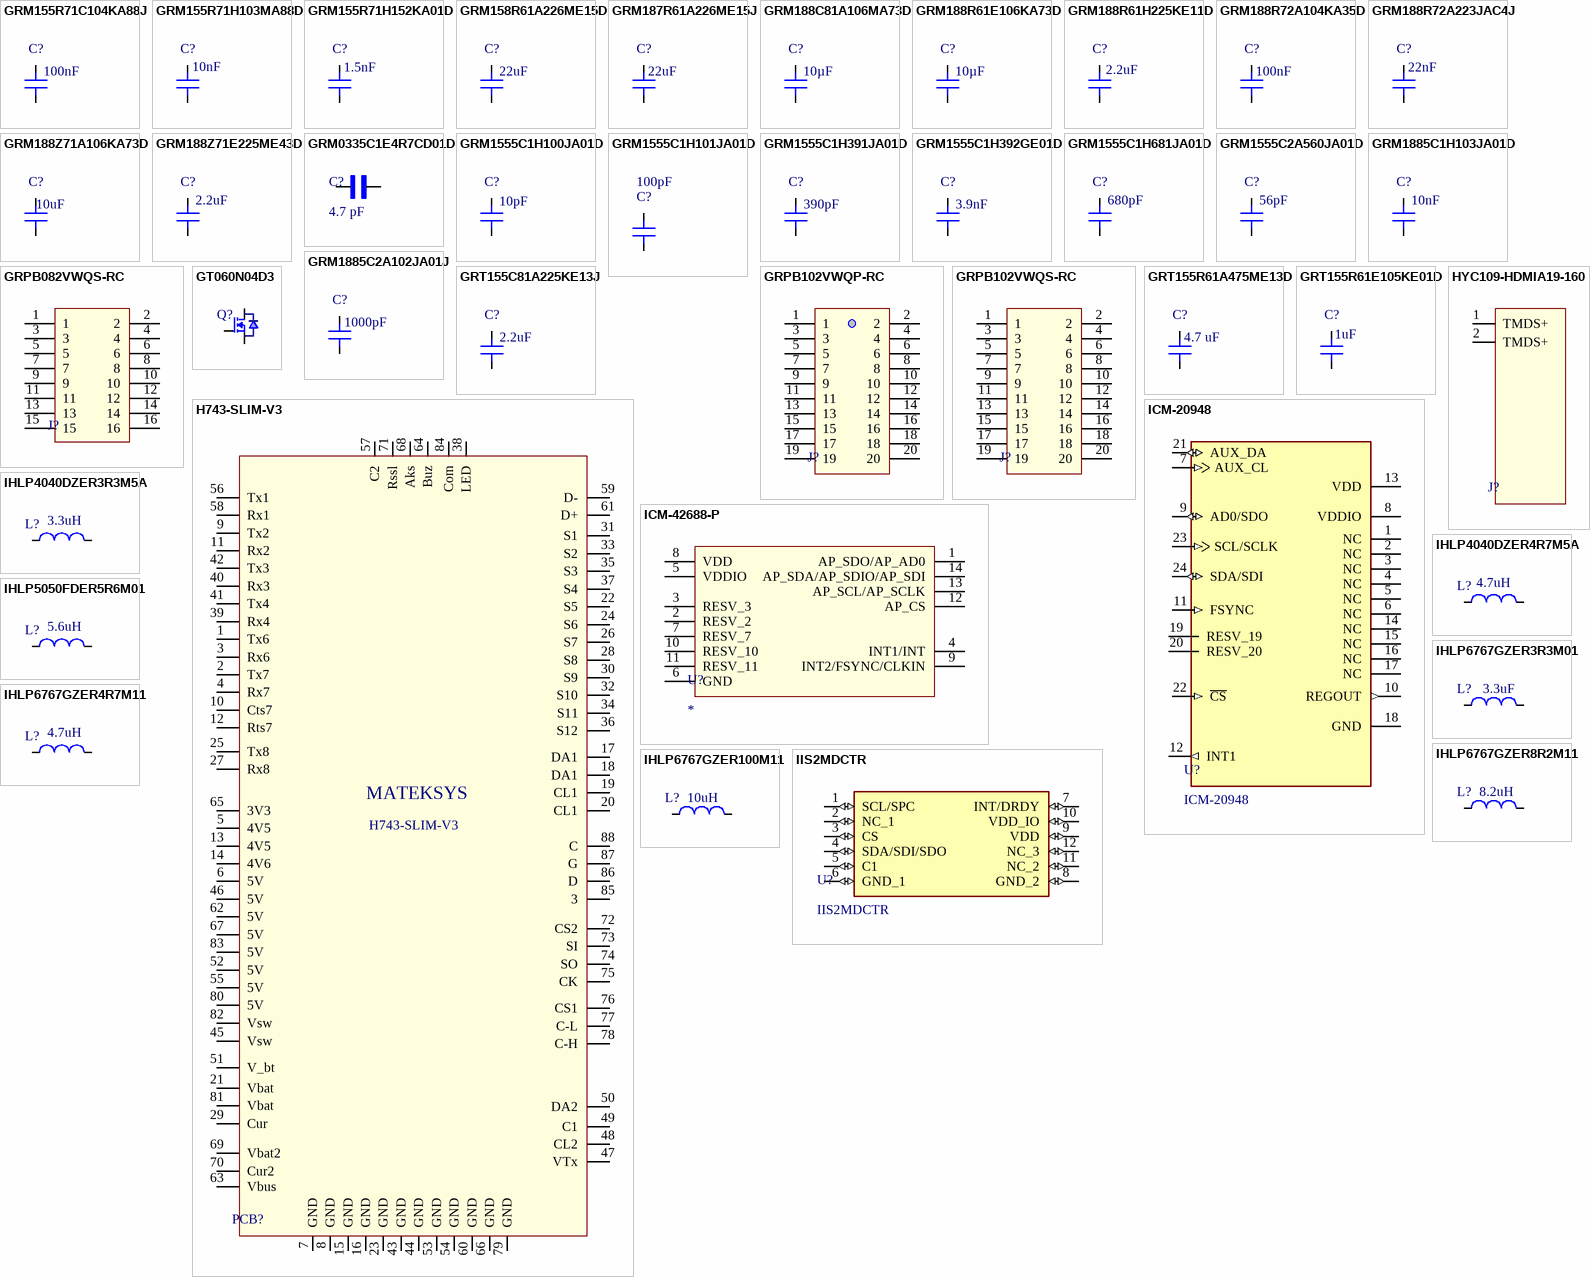
[diagram p12: symbols GRM155R71C104KA88J to IIS2MDCTR]

## GRM155R71C104KA88J
designator C?  value 100nF  (hidden comment: *)
Multilayer Ceramic Capacitor, 0.1 uF, 16 V, ï¿½ 10%, X7R, 0402 [1005 Metric]; Manufacturer: Murata; Manufacturer Part Number: GRM155R71C104KA88J; Material: 4241ConductorMaterial; Voltage Rating: 16V; Supplier: Mouser; Supplier Part Number: 81-GRM155R71C104KA8J; RoHS: Yes; Category: Ceramic Capacitors; Stock: 489230; Pricing: 1=0.1, 10=0.023, 50=0.023, 100=0.014, 1000=0.009, 10000=0.007 (USD); Mounting Technology: Surface Mount; Case/Package: 0402; Pins: 2NUMBER; Case Code (Metric): 1005; Case Code (Imperial): 0402; Min Operating Temperature: -55°C; Max Operating Temperature: 125°C; Package Quantity: 1; Tolerance: 10%; Packaging: Tape and Reel; Dielectric: X7R; Voltage Rating (DC): 16V; Termination: SMD/SMT; Voltage: 16V; Series: GRM; Construction: Flat; Length: 1mm; Width: 0.02inch; Height: 0.5mm; Thickness: 0.022inch; Depth: 0.5mm; Radiation Hardening: No; Reach SVHC Compliant: No; Lead Free: Lead Free; RoHS Compliant: Yes; ComponentLink1URL: https://datasheet.ciiva.com/6271/product-6271168.pdf?src-supplier=Digikey; ComponentLink1Description: https://datasheet.ciiva.com/6271/product-6271168.pdf?src-supplier=Digikey; ComponentLink2URL: https://datasheet.ciiva.com/6271/grm155r71c104ka88-01-6271231.pdf?src-supplier=Digikey; ComponentLink2Description: https://datasheet.ciiva.com/6271/grm155r71c104ka88-01-6271231.pdf?src-supplier=Digikey
footprint C 0402 (1005 Metric) (Chip Capacitor, Body 1.0x0.5mm, IPC High Density)
pins: 1 B, 2 A

## GRM155R71H103MA88D
designator C?  value 10nF  (hidden comment: *)
Cap Ceramic 0.01uF 50V X7R 20% SMD 0402 125°C Paper T/R; Manufacturer: Murata; Manufacturer Part Number: GRM155R71H103MA88D; Supplier: Mouser; Supplier Part Number: 81-GRM155R71H103MA8D; RoHS: Yes; Category: Ceramic Capacitors; Stock: 64523; Pricing: 1=0.10000, 10=0.01200, 50=0.01200, 100=0.01000, 1000=0.00600, 10000=0.00400 (USD); Mounting Technology: Surface Mount; Case/Package: 0402; Min Operating Temperature: -55°C; Max Operating Temperature: 125°C; Tolerance: 20%; Packaging: Tape and Reel; Dielectric: X7R; Voltage Rating (DC): 50V; Construction: Flat; Length: 1mm; Width: 500um; Height: 0.5mm; Depth: 0.5mm; Thickness: 500um; Radiation Hardening: No; RoHS Compliant: Yes; ComponentLink1URL: https://datasheet.ciiva.com/11619/product-11619919.pdf?src-supplier=Avnet; ComponentLink1Description: https://datasheet.ciiva.com/11619/product-11619919.pdf?src-supplier=Avnet
footprint C 0402 (1005 Metric) (Chip Capacitor, Body 1.0x0.5mm, IPC High Density)
pins: 1 B, 2 A
